# Altium footprint library PROC051C_PCB.PcbLib: 118 footprints (part 8 of 8)
Each footprint in its own frame and in the unit in brackets; x right, y up, seen from the top. Pads: shape width x height; smd on the part's side, far side on the other; paste and mask are expansions set on the pad; w line width, h text height; cw(c..) or ccw(c..) is an arc to the next point about the centre after c.
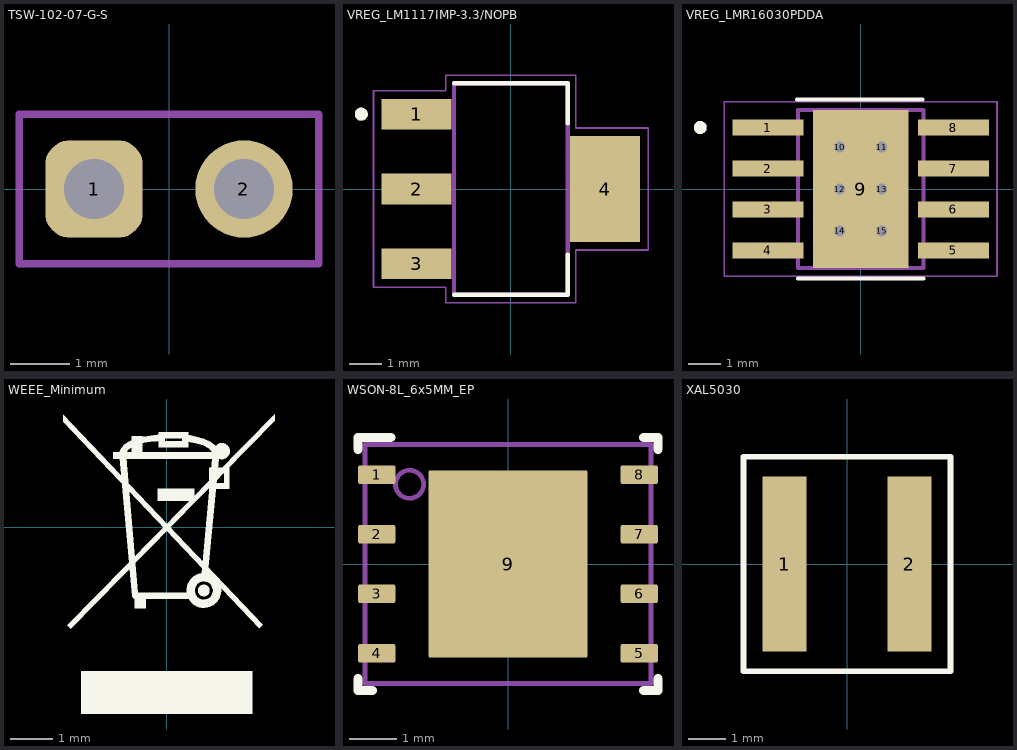
[diagram p7: the footprints below, top view; thin cyan lines are the x and y axes]

## TSW-102-07-G-S [mm] "Samtec 100mil, 1x2, 230 mil above insulator"
height 8.382
pads (2):
  rrect50% 1.65x1.65 hole 1.016: 1(-1.27,0)
  round 1.65 hole 1.016: 2(1.27,0)
Mechanical 5:
  lines w0.127: -2.54,-1.27 2.54,-1.27 2.54,1.27 -2.54,1.27 -2.54,-1.27
  text ".Designator" at 0.701,0.626 h1.02
3D body "SamtecTSW-07_2x1.stp": height 8.38, standoff -2.54, extent -2.54,-1.27 2.54,1.27

## VREG_LM1117IMP-3.3/NOPB [mm]
height 1.8
pads (4):
  rect 2.15x0.95 smd: 1(-2.9,2.3) 2(-2.9,0) 3(-2.9,-2.3)
  rect 2.15x3.25 smd: 4(2.9,0)
Top Overlay:
  circle w0.2: c-4.6,2.3 r0.1
  lines w0.127: -1.75,-3.25 1.75,-3.25 1.75,-2.01 ; -1.75,3.25 1.75,3.25 1.75,2.01
Mechanical 13:
  circle w0.2: c-4.6,2.3 r0.1
  lines w0.127: -1.75,-3.25 1.75,-3.25 1.75,3.25 -1.75,3.25 -1.75,-3.25
Mechanical 15:
  lines w0.05: -4.225,-3.025 -2,-3.025 -2,-3.5 2,-3.5 2,-1.875 4.225,-1.875 4.225,1.875 2,1.875 2,3.5 -2,3.5 -2,3.025 -4.225,3.025 -4.225,-3.025
3D body "step_temp.STEP": height 1.8, standoff 0, extent -3.499,-3.25 3.499,3.25

## VREG_LMR16030PDDA [mm]
height 1.7
pads (15):
  rect 2.2x0.5 smd paste-0.025 mask+0.07: 1(-2.875,1.905) 2(-2.875,0.635) 3(-2.875,-0.635) 4(-2.875,-1.905) 5(2.875,-1.905) 6(2.875,-0.635) 7(2.875,0.635) 8(2.875,1.905)
  rect 2.95x4.9 smd paste-3 mask+0: 9(0,0)
  round 0.44 hole 0.33: 10(-0.65,1.3) 11(0.65,1.3) 12(-0.65,0) 13(0.65,0) 14(-0.65,-1.3) 15(0.65,-1.3)
Top Overlay:
  circle w0.2: c-4.975,1.905 r0.1
  lines w0.127: -1.98,2.77 1.92,2.77 ; -1.95,-2.77 1.95,-2.77
Top Paste:
  region: 1.3,-1.65 -1.3,-1.65 -1.3,1.65 1.3,1.65
Top Solder:
  region: 1.3,-1.65 -1.3,-1.65 -1.3,1.65 1.3,1.65
Mechanical 13:
  circle w0.2: c-4.975,1.905 r0.1
  lines w0.127: -1.95,-2.45 -1.95,2.45 1.95,2.45 1.95,-2.45 -1.95,-2.45
Mechanical 15:
  lines w0.05: -4.225,-2.7 4.225,-2.7 4.225,2.7 -4.225,2.7 -4.225,-2.7
3D body "step_temp.STEP": height 1.7, standoff 0, extent -3,-2.45 3,2.45

## WEEE_Minimum [mm] "WEEElie bin"
Top Overlay:
  drawing of 23 lines, arcs and shapes, not listed

## WSON-8L_6x5MM_EP [mm] "SMD, 8-Leads, Body 6x5mm, Pitch 1.27mm"
height 0.8
pads (13):
  rrect25% 0.8x0.4 smd: 1(-2.8,1.905) 2(-2.8,0.635) 3(-2.8,-0.635) 4(-2.8,-1.905) 5(2.8,-1.905) 6(2.8,-0.635) 7(2.8,0.635) 8(2.8,1.905)
  rrect3% 3.4x4 smd paste-3: 9(0,0)
  rrect50% 1.468x1.698 on Top Paste: ""(-0.834,-0.949) ""(-0.834,0.949) ""(0.834,-0.949) ""(0.834,0.949)
Top Overlay:
  lines w0.2: -3.2,-2.45 -3.2,-2.7 -2.9,-2.7 ; -3.2,2.45 -3.2,2.7 -2.5,2.7 ; 2.9,-2.7 3.2,-2.7 3.2,-2.45 ; 2.9,2.7 3.2,2.7 3.2,2.45
Mechanical 5:
  circle w0.1: c-2.1,1.7 r0.3
  lines w0.1: -3.05,-2.55 3.05,-2.55 3.05,2.55 -3.05,2.55 -3.05,-2.55
  text ".Designator" at -1,-0.2 h0.6
3D body: height 0.8, standoff 0, extent -3.05,-2.55 3.05,2.55
3D body: height 0.8, standoff 0.5, extent -2.399,1.401 -1.8,2

## XAL5030 [mil] "Coilcraft XAL5030 12/12/11"
height 122.05
pads (2):
  rect 46x183 smd: 1(-65,0) 2(65,0)
Top Overlay:
  lines w6: -108,-112 -108,112 108,112 108,-112 -108,-112
Mechanical 5:
  lines w5: -108,-112 -108,112 108,112 108,-112 -108,-112
  text ".Designator" at 19.55,17.8 h40
3D body: height 122.05, standoff 0, extent -107.98,-111.98 107.98,111.98
3D body: height 122.1, standoff 80, extent 70.02,-49.98 79.98,49.98